# Altium footprint library MCBoard_pcb.PcbLib: 77 footprints (part 1 of 5)
Each footprint in its own frame and in the unit in brackets; x right, y up, seen from the top. Pads: shape width x height; smd on the part's side, far side on the other; paste and mask are expansions set on the pad; w line width, h text height; cw(c..) or ccw(c..) is an arc to the next point about the centre after c.
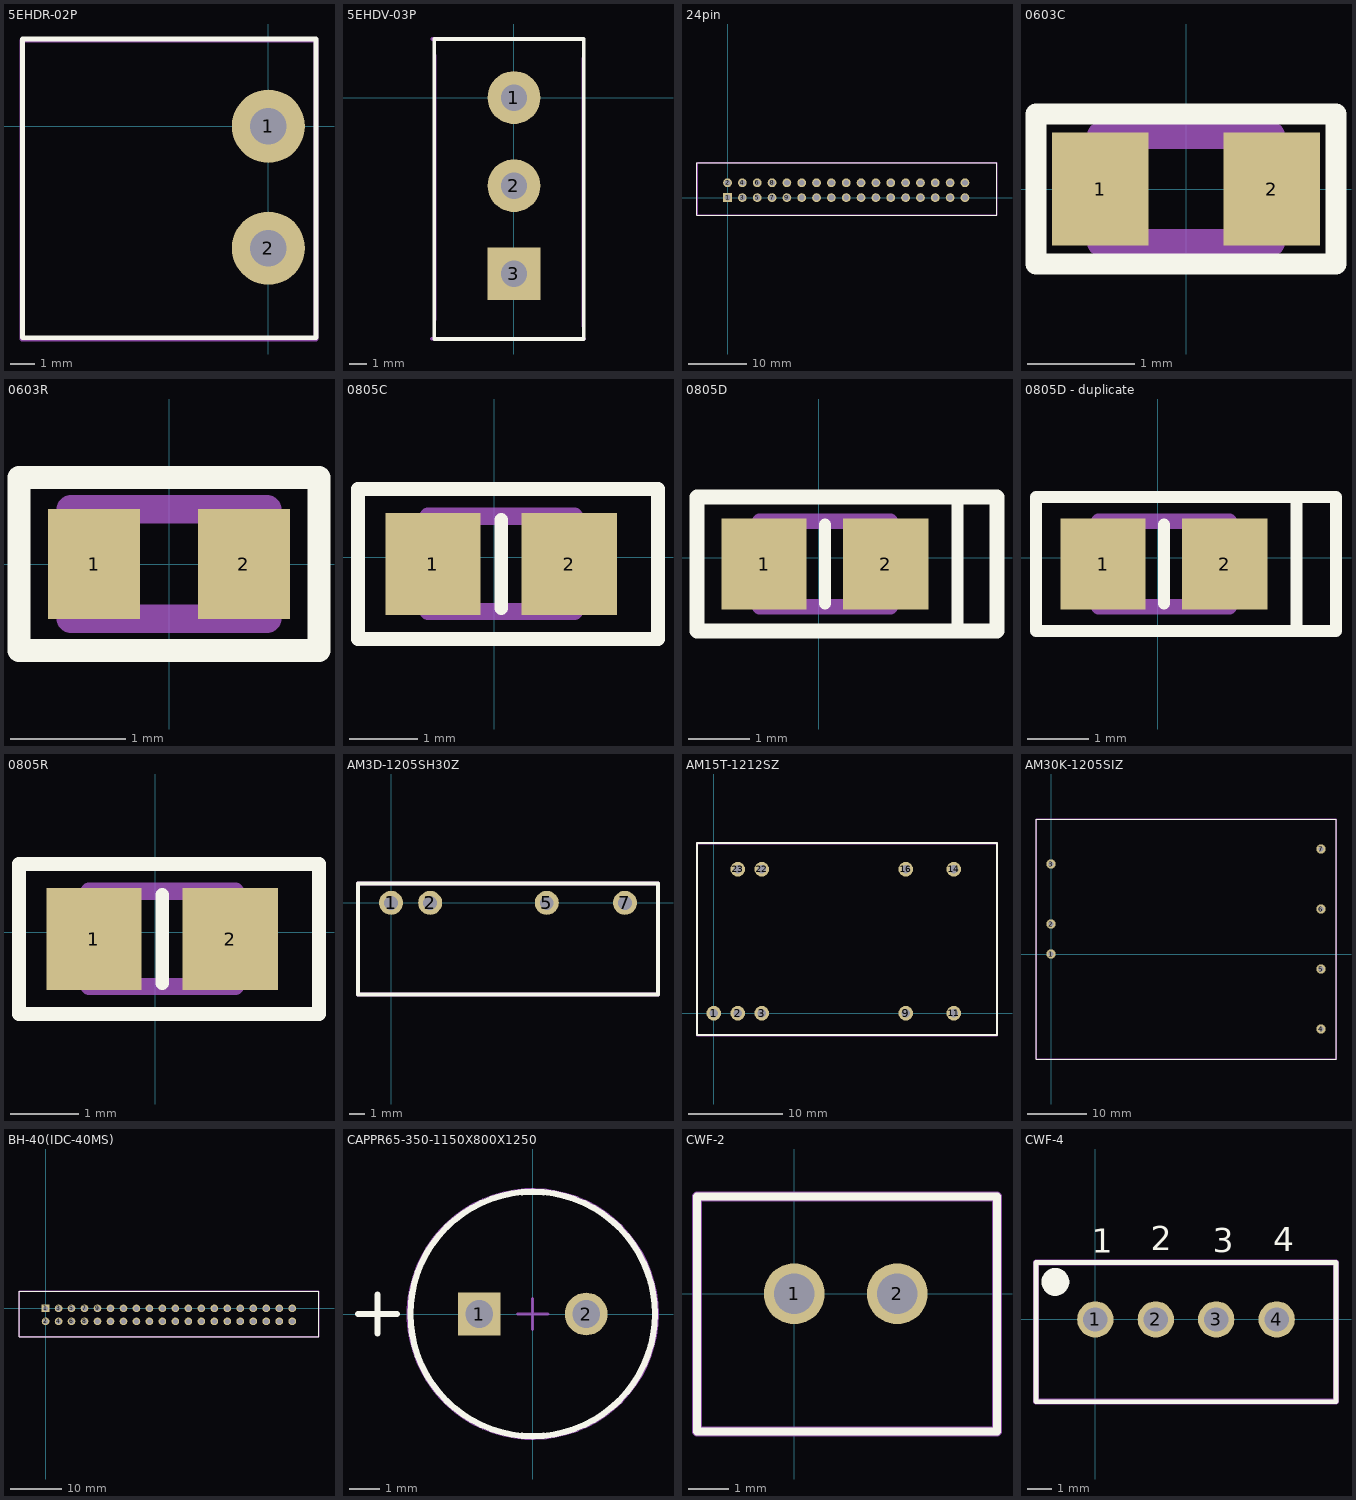
[diagram p0: the footprints below, top view; thin cyan lines are the x and y axes]

## 5EHDR-02P [mm]
pads (2):
  round 3 hole 1.5 paste+0: 1(0,0) 2(0,-5)
Top Overlay:
  lines w0.2: -10.075,-8.675 -10.075,3.575 1.95,3.575 1.95,-8.675 -10.075,-8.675
Pattern top:
  lines w0.2: -10.1,-8.725 1.95,-8.725 1.95,3.525 -10.1,3.525 -10.1,-8.725
3D body "User Library-TB5_08-2R.STEP": height 8.45, standoff -4.2, extent -10,-8.64 2,3.52

## 5EHDV-03P [mm]
pads (3):
  round 3 hole 1.5 paste+0: 1(0,0) 2(0,-5)
  rect 3x3 hole 1.5 paste+0: 3(0,-10)
Top Overlay:
  lines w0.2: -4.525,-13.7 3.95,-13.7 3.95,3.325 -4.525,3.325 -4.525,-13.7
Pattern top:
  lines w0.2: -4.675,-13.675 3.995,-13.675 ; -4.625,3.325 3.845,3.325 ; -4.5,-12.6 -4.5,2.4 ; 3.92,-12.975 3.92,2.225
3D body "User Library-5EHDVC-3P.STEP": height 12, standoff -3.5, extent -4.475,-13.725 3.875,3.275

## 24pin [mm]
pads (34):
  rect 1.5x1.5 hole 1: 1(0,0)
  round 1.5 hole 1: 2(0,2.54) 3(2.54,0) 4(2.54,2.54) 5(5.08,0) 6(5.08,2.54) 7(7.62,0) 8(7.62,2.54) 9(10.16,0) 10(10.16,2.54) 11(12.7,0) 12(12.7,2.54) 13(15.24,0) 14(15.24,2.54) 15(17.78,0) 16(17.78,2.54) 17(20.32,0) 18(20.32,2.54) 19(22.86,0) 20(22.86,2.54) 21(25.4,0) 22(25.4,2.54) 23(27.94,0) 24(27.94,2.54) 25(30.48,0) 26(30.48,2.54) 27(33.02,0) 28(33.02,2.54) 29(35.56,0) 30(35.56,2.54) 31(38.1,0) 32(38.1,2.54) 33(40.64,0) 34(40.64,2.54)
Top Overlay:
  lines w0.2: -5.201,6 -5.224,5.977 -5.224,-3.017 46.076,-3.017 46.11,-2.982 46.11,6 46.109,6.001 -5.2,6.001
Bottom Overlay:
  lines w0.2: -5.214,-2.989 -5.2,-2.975 ; -5.2,6 -5.2,6.001 46.052,6.001 46.126,5.926 46.126,-3.004 -5.171,-3.004
  lines w0.254: -5.2,-2.975 -5.2,6.001
Pattern top:
  lines w0.25: -5.224,6 -5.224,-3.017 46.076,-3.017 ; -5.108,6.001 46.05,6.001 ; 46.11,-3.047 46.11,6
  lines w0.254: -5.2,-3 -5.2,-0.5
  text ".Designator" at 15.1,3.2 h2.13
3D body "BH-34.STEP": height 9, standoff -3.1, extent -5.044,-3.154 45.736,5.846

## 0603C [mm] "Chip Resistor, 2-Leads, Body 1,40x0,80mm, IPC Medium Density"
height 0.9
pads (2):
  rect 0.9x1.05 smd: 1(-0.8,0) 2(0.8,0)
Top Overlay:
  lines w0.2: -1.4,-0.7 1.4,-0.7 1.4,0.7 -1.4,0.7 -1.4,-0.7
Pattern top:
  lines w0.25: -0.8,-0.5 0.8,-0.5 0.8,0.5 -0.8,0.5 -0.8,-0.5
  text ".Designator" at -2.2,1.4 h2.13
3D body "CAPC-0603-T0.9-BN.stp": height 0.9, standoff 0, extent -0.85,-0.45 0.85,0.45

## 0603R [mm] "Chip Resistor, 2-Leads, Body 1.60x0.85mm, IPC Medium Density"
height 0.5
pads (2):
  rect 0.8x0.95 smd: 1(-0.65,0) 2(0.65,0)
Top Overlay:
  lines w0.2: -1.3,-0.75 1.3,-0.75 1.3,0.75 -1.3,0.75 -1.3,-0.75
Pattern top:
  lines w0.25: -0.85,-0.475 0.85,-0.475 0.85,0.475 -0.85,0.475 -0.85,-0.475
  text ".Designator" at -2.4,1.4 h2.13
3D body "NTC-0603-T0.9.stp": height 0.9, standoff 0, extent -0.875,-0.475 0.875,0.475

## 0805C [mm]
pads (2):
  rect 1.4x1.5 smd: 1(-0.9,-0.1) 2(1.1,-0.1)
Top Overlay:
  lines w0.2: 0.1,-0.75 0.1,0.55 ; -2,-1.2 -2,1 2.4,1 2.4,-1.2 -2,-1.2
Pattern top:
  lines w0.25: -0.975,-0.8 1.175,-0.8 1.175,0.6 -0.975,0.6 -0.975,-0.8
  text ".Designator" at -3.4,1.6 h2.13
3D body "CAPC-0805-T1.35-BN.stp": height 0.67, standoff -0.67, extent -0.95,-0.8 1.15,0.55

## 0805D [mm]
pads (2):
  rect 1.4x1.5 smd: 1(-0.9,-0.1) 2(1.1,-0.1)
Top Overlay:
  lines w0.2: 0.1,-0.75 0.1,0.55 ; 2.275,1 2.275,-1.15 2.325,-1.2 2.925,-1.2
  lines w0.254: -2,-1.2 -2,1 2.925,1 2.925,-1.2 -2,-1.2
Pattern top:
  lines w0.25: -0.975,-0.8 1.175,-0.8 1.175,0.6 -0.975,0.6 -0.975,-0.8
3D body: height 0.7, standoff 0, extent -0.975,-0.8 1.175,0.6

## 0805D - duplicate [mm]
pads (2):
  rect 1.4x1.5 smd: 1(-0.9,-0.1) 2(1.1,-0.1)
Top Overlay:
  lines w0.2: 0.1,-0.75 0.1,0.55 ; 2.275,1 2.275,-1.15 2.325,-1.2 2.925,-1.2 ; 2.925,-1.2 -2,-1.2 -2,1 2.925,1 2.925,-1.2
Pattern top:
  lines w0.25: -0.975,-0.8 1.175,-0.8 1.175,0.6 -0.975,0.6 -0.975,-0.8
  text ".Designator" at -1.8,1.5 h2.15
3D body: height 0.7, standoff 0, extent -0.975,-0.8 1.175,0.6

## 0805R [mm]
pads (2):
  rect 1.4x1.5 smd: 1(-0.9,-0.1) 2(1.1,-0.1)
Top Overlay:
  lines w0.2: 0.1,-0.75 0.1,0.55 ; -2,-1.2 -2,1 2.4,1 2.4,-1.2 -2,-1.2
Pattern top:
  lines w0.25: -0.975,-0.8 1.175,-0.8 1.175,0.6 -0.975,0.6 -0.975,-0.8
  text ".Designator" at -1.4,1.8 h2.13
3D body "User Library-Chip Resistor2.step": height 0.5, standoff 0, extent -0.9,-0.7 1.1,0.5

## AM3D-1205SH30Z [mm]
height 9.5
pads (4):
  round 1.56 hole 0.9: 1(0,0) 2(2.54,0) 5(10.12,0) 7(15.2,0)
Top Overlay:
  lines w0.254: -2.15,-5.95 17.35,-5.95 17.35,1.25 -2.15,1.25 -2.15,-5.95
Pattern top:
  lines w0.254: -2.15,-5.95 -2.15,1.25 17.35,1.25 17.35,-5.95 -2.15,-5.95
  text ".Designator" at 3.8,-3.1 h2.13
3D body "DC-DC.STEP": height 10.5, standoff -2.55, extent -2.15,-5.9 17.35,1.3

## AM15T-1212SZ [mm]
pads (9):
  round 1.56 hole 0.9: 1(0,0) 2(2.54,0) 3(5.08,0) 9(20.32,0) 11(25.4,0) 14(25.4,15.24) 16(20.32,15.24) 22(5.08,15.24) 23(2.54,15.24)
Top Overlay:
  lines w0.2: 2.54,18.034 -1.778,18.034 ; -1.778,18.034 -1.778,-2.286 29.972,-2.286 29.972,18.034 -1.778,18.034
Pattern top:
  lines w0.25: 2.54,18 -1.778,18 ; -1.778,18 29.972,18 29.972,-2.32 -1.778,-2.32 -1.778,18
  text ".Designator" at 9.3,8.1 h2.13
3D body "AM15T-1212SZ(DC-DC преобр).STEP": height 11.16, standoff -2.05, extent -1.905,-2.54 29.845,17.78

## AM30K-1205SIZ [mm]
pads (7):
  round 1.56 hole 0.9: 1(0,0) 2(0,5.08) 3(0,15.24) 4(45.72,-12.7) 5(45.72,-2.54) 6(45.72,7.62) 7(45.72,17.78)
Top Overlay:
  lines w0.2: 48.26,17.78 48.26,22.86 ; 48.26,22.86 -2.54,22.86 -2.54,-17.78 48.26,-17.78 48.26,22.86
Pattern top:
  lines w0.25: 48.26,17.78 48.26,22.86 ; 48.26,22.86 48.26,-17.78 -2.54,-17.78 -2.54,22.86 48.26,22.86
  text ".Designator" at 14.3,2.1 h2.13
3D body "AM30K-1205SIZ(DC-DC перобр).STEP": height 10.16, standoff -5.59, extent -2.54,-17.78 48.26,22.86

## BH-40(IDC-40MS) [mm]
pads (40):
  rect 1.5x1.5 hole 1: 1(0,0)
  round 1.5 hole 1: 2(0,-2.54) 3(2.54,0) 4(2.54,-2.54) 5(5.08,0) 6(5.08,-2.54) 7(7.62,0) 8(7.62,-2.54) 9(10.16,0) 10(10.16,-2.54) 11(12.7,0) 12(12.7,-2.54) 13(15.24,0) 14(15.24,-2.54) 15(17.78,0) 16(17.78,-2.54) 17(20.32,0) 18(20.32,-2.54) 19(22.86,0) 20(22.86,-2.54) 21(25.4,0) 22(25.4,-2.54) 23(27.94,0) 24(27.94,-2.54) 25(30.48,0) 26(30.48,-2.54) 27(33.02,0) 28(33.02,-2.54) 29(35.56,0) 30(35.56,-2.54) 31(38.1,0) 32(38.1,-2.54) 33(40.64,0) 34(40.64,-2.54) 35(43.18,0) 36(43.18,-2.54) 37(45.72,0) 38(45.72,-2.54) 39(48.26,0) 40(48.26,-2.54)
Top Overlay:
  lines w0.2: -5.2,-5.6 53.5,-5.6 53.5,3.4 -5.2,3.4 -5.2,-5.6
Bottom Overlay:
  lines w0.2: -5.2,-5.6 53.5,-5.6 53.5,3.4 -5.2,3.4 -5.2,-5.6
Pattern top:
  lines w0.25: -5.2,-5.6 -5.2,3.4 53.5,3.4 53.5,-5.6 -5.2,-5.6
  text ".Designator" at 19.6,1.4 h2.13
3D body "BH-40.STEP": height 9, standoff -3.1, extent -5.045,-5.795 53.355,3.205

## CAPPR65-350-1150X800X1250 [mm] "THD, 2-Leads, Dia 8mm, Body 11.5mm"
height 12.5
pads (2):
  rect 1.4x1.4 hole 0.9: 1(-1.75,0)
  round 1.4 hole 0.9: 2(1.75,0)
Top Overlay:
  circle w0.2: c0,0 r4
  lines w0.2: -5.715,0 -4.445,0 ; -5.08,-0.635 -5.08,0.635
Mechanical 13:
  circle w0.1: c0,0 r4
Mechanical 15:
  circle w0.05: c0,0 r4.1
  lines w0.1: -0.5,0 0.5,0 ; 0,-0.5 0,0.5
3D body: height 12.5, standoff 0, extent -3.999,-3.999 3.999,3.999

## CWF-2 [mm] "перемычка для плат"
pads (2):
  round 1.5 hole 1: 1(0,0) 2(2.54,0)
Top Overlay:
  lines w0.2: -2.4,-3.4 5,-3.4 5,2.4 -2.4,2.4 -2.4,-3.4
Pattern top:
  lines w0.25: -2.4,-3.4 -2.4,2.4 5,2.4 5,-3.4 -2.4,-3.4
  text ".Designator" at -1.7,-2.3 h2.13
3D body "cwf-2.STEP": height 7, standoff -3.4, extent -2.4,-3.375 5,2.375

## CWF-4 [mm]
pads (4):
  round 1.5 hole 1: 1(0,0) 2(2.5,0) 3(5,0) 4(7.5,0)
Top Overlay:
  circle w0.75: c-1.65,1.55 r0.2
  lines w0.2: -2.45,-3.4 -2.45,2.35 9.95,2.35 9.95,0 9.95,-3.4 -2.45,-3.4
  text "1" at -0.15,2.75 h1
  text "2" at 2.3,2.85 h1
  text "3" at 4.85,2.775 h1
  text "4" at 7.35,2.825 h1
Top Solder:
  lines w0.1: 6.35,-0.75 6.375,-0.75 6.875,-1.25 8,-1.25 8.187,-1.062 8.563,-0.687 ; 6.375,0.775 6.875,1.275 8.1,1.275 8.75,0.625 8.75,-0.5 8.563,-0.687 ; 8.563,-0.687 8.563,-0.687
Pattern top:
  lines w0.25: -2.45,-3.4 9.95,-3.4 9.95,0 9.95,2.35 -2.45,2.35 -2.45,-3.4
  text ".Designator" at 0,-2.4 h2.13
3D body "cwf-4.STEP": height 7, standoff -3.4, extent -2.4,-3.475 10,2.275